# Altium footprint library Connectors.PcbLib: 69 footprints (part 1 of 5)
Each footprint in its own frame and in the unit in brackets; x right, y up, seen from the top. Pads: shape width x height; smd on the part's side, far side on the other; paste and mask are expansions set on the pad; w line width, h text height; cw(c..) or ccw(c..) is an arc to the next point about the centre after c.
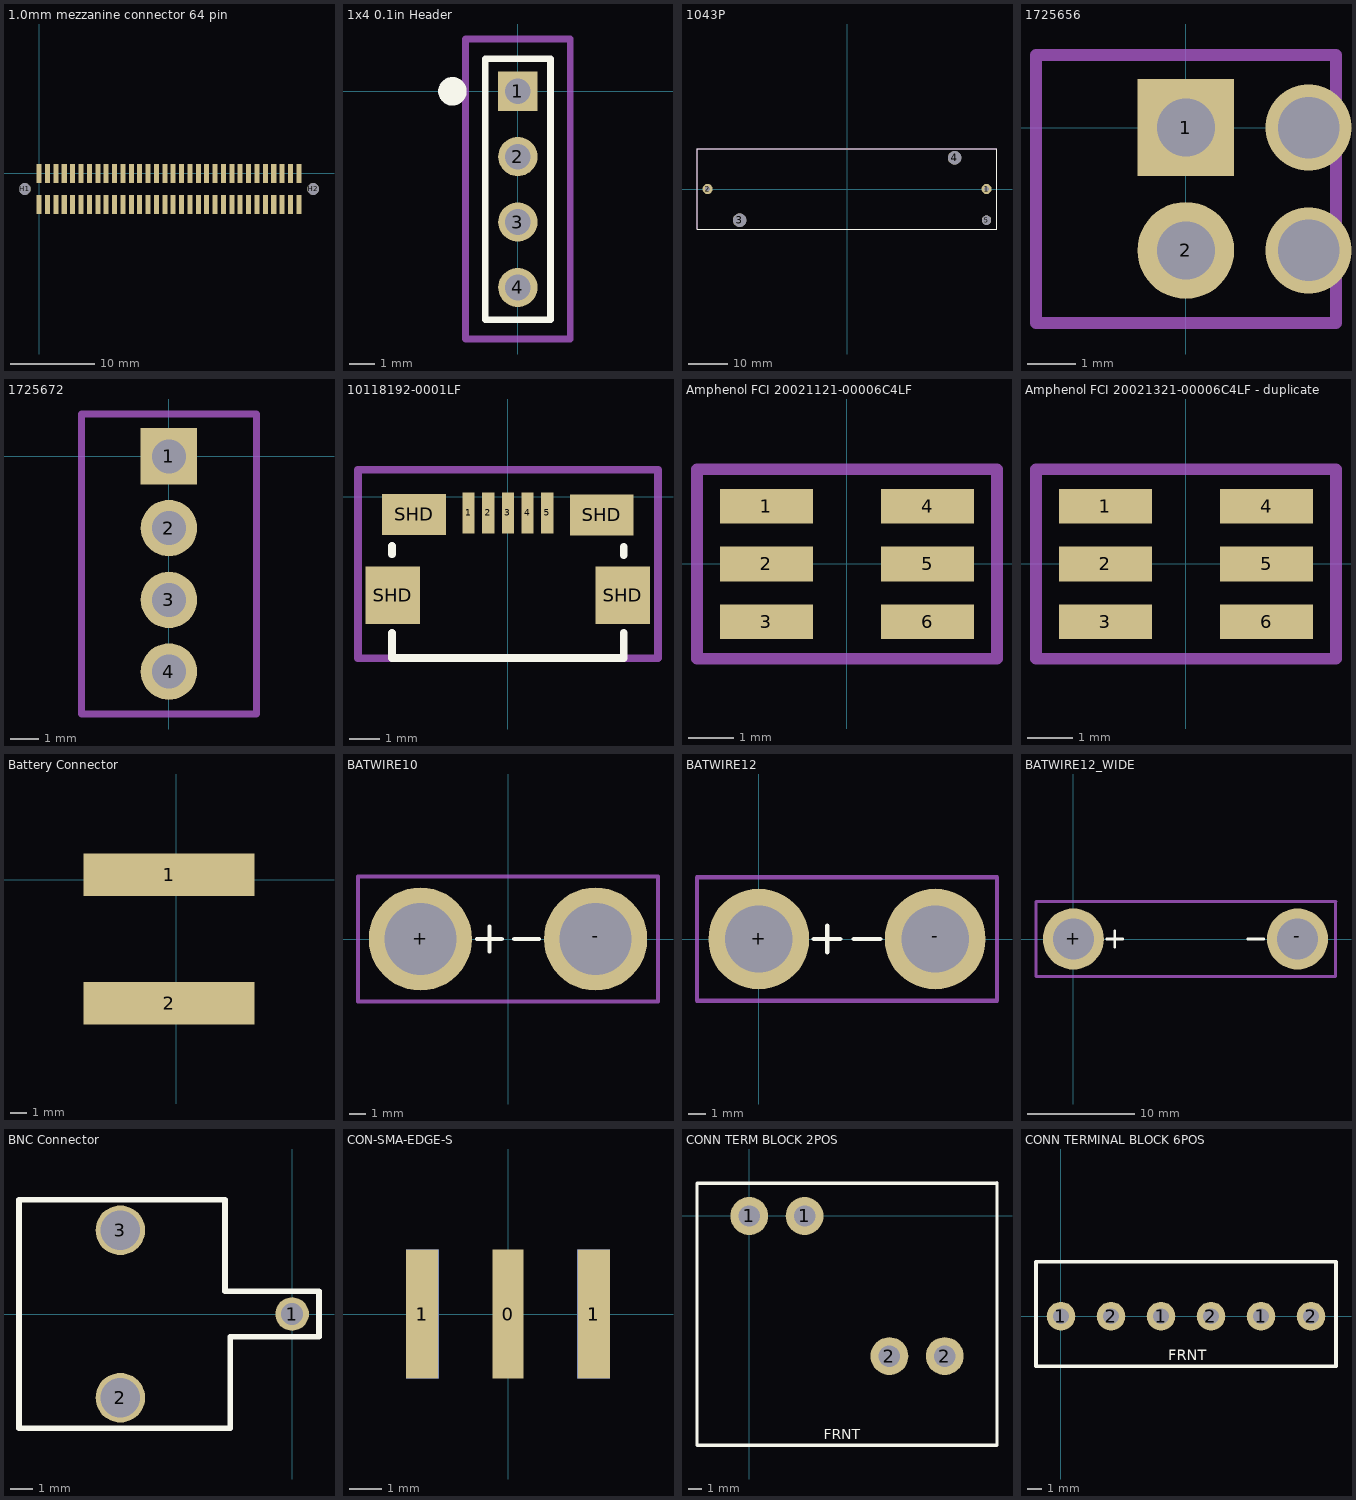
[diagram p0: the footprints below, top view; thin cyan lines are the x and y axes]

## 1.0mm mezzanine connector 64 pin [mm]
pads (66):
  rect 0.6x2.3 smd: 1(0,0) 2(1,0) 3(2,0) 4(3,0) 5(4,0) 6(5,0) 7(6,0) 8(7,0) 9(8,0) 10(9,0) 11(10,0) 12(11,0) 13(12,0) 14(13,0) 15(14,0) 16(15,0) 17(16,0) 18(17,0) 19(18,0) 20(19,0) 21(20,0) 22(21,0) 23(22,0) 24(23,0) 25(24,0) 26(25,0) 27(26,0) 28(27,0) 29(28,0) 30(29,0) 31(30,0) 32(31,0) 33(0,-3.7) 34(1,-3.7) 35(2,-3.7) 36(3,-3.7) 37(4,-3.7) 38(5,-3.7) 39(6,-3.7) 40(7,-3.7) 41(8,-3.7) 42(9,-3.7) 43(10,-3.7) 44(11,-3.7) 45(12,-3.7) 46(13,-3.7) 47(14,-3.7) 48(15,-3.7) 49(16,-3.7) 50(17,-3.7) 51(18,-3.7) 52(19,-3.7) 53(20,-3.7) 54(21,-3.7) 55(22,-3.7) 56(23,-3.7) 57(24,-3.7) 58(25,-3.7) 59(26,-3.7) 60(27,-3.7) 61(28,-3.7) 62(29,-3.7) 63(30,-3.7) 64(31,-3.7)
  round 1.4 hole 1.4 unplated: H1(-1.7,-1.85) H2(32.7,-1.85)

## 1x4 0.1in Header [mil]
pads (4):
  rect 60x60 hole 39.37: 1(0,0)
  round 60 hole 39.37: 2(0,-100) 3(0,-200) 4(0,-300)
Top Overlay:
  circle w23.62: c-100,0 r10
  lines w10: -50,-349.41 -50,50 50,50 50,-349.41 -50,-349.41
Mechanical 15:
  lines w10: -80,-378.94 -80,80 80,80 80,-378.94 -80,-378.94

## 1043P [mil] "HOLDER FOR 18650 BATTERY"
pads (5):
  round 104 hole 52: 1(1411,0) 2(-1411,0)
  round 136 hole 136 unplated: 3(-1087.5,-315) 4(1087.5,315)
  round 94 hole 94 unplated: 5(1411,-315)
Top Overlay:
  lines w10: -1518,-406.5 -1518,406.5 ; -1517,-406.5 1517,-406.5 1517,406.5 -1517,406.5
Mechanical 13:
  lines w10: -1518,-406.5 -1518,406.5 ; -1517,-406.5 1517,-406.5 1517,406.5 -1517,406.5
3D body "keystone-PN1043P.STEP": height 585, standoff -140, extent -1518.81,-408 1514.81,405

## 1725656 [mm] "CONN TERM BLOCK 2.54MM 2POS"
height 8.5
pads (2):
  rect 2x2 hole 1.2: 1(0,0)
  round 2 hole 1.2: 2(0,-2.54)
via 2.54,0 diameter 1.778 hole 1.27
via 2.54,-2.54 diameter 1.778 hole 1.27
Mechanical 15:
  lines w0.254: -3.096,-4.04 -3.096,1.5 3.104,1.5 3.104,-4.04 -3.048,-4.04

## 1725672 [mm] "CONN TERM BLOCK 2.54MM 2POS"
height 8.5
pads (4):
  rect 2x2 hole 1.2: 1(0,0)
  round 2 hole 1.2: 2(0,-2.54) 3(0,-5.08) 4(0,-7.62)
Mechanical 15:
  lines w0.254: -3.096,-9.12 3.104,-9.12 3.104,1.5 -3.096,1.5 -3.096,-9.12

## 10118192-0001LF [mm] "USB Micro-B Recepticle"
height 2.8
pads (9):
  rect 0.4x1.35 smd: 1(-1.3,-0.533) 2(-0.65,-0.533) 3(0,-0.533) 4(0.65,-0.533) 5(1.3,-0.533)
  rect 1.8x1.9 smd: SHD(-3.8,-3.248) SHD(3.8,-3.248)
  rect 2.1x1.35 smd: SHD(-3.1,-0.584) SHD(3.1,-0.598)
Top Overlay:
  lines w0.254: -3.825,-4.5 -3.825,-5.325 3.825,-5.325 3.825,-4.5 ; -3.825,-1.9 -3.825,-1.625 ; 3.825,-1.925 3.825,-1.65
Mechanical 1:
  lines w0.254: -2,-5.315 2,-5.315
Mechanical 15:
  lines w0.254: 4.95,-5.332 -4.95,-5.332 -4.95,0.889 4.95,0.889 ; 4.957,-5.325 4.957,0.889
3D body "UsbMicro.STEP": height 3.09, standoff 0.08, extent -3.956,-5.984 3.956,-0.324

## Amphenol FCI 20021121-00006C4LF [mm] "6 Positions Header Connector"
pads (6):
  rect 2.05x0.76 smd: 1(-1.775,1.27) 2(-1.775,0) 3(-1.775,-1.27) 4(1.775,1.27) 5(1.775,0) 6(1.775,-1.27)
Mechanical 15:
  lines w0.254: -3.302,-2.083 -3.302,2.083 3.302,2.083 3.302,-2.083 -3.302,-2.083
3D body: height 0.25, standoff 0, extent -2.286,1.346 -2.286,1.346
3D body "20021121-00006XXLFc.STEP": height 4.51, standoff 0.01, extent -2.75,-1.905 2.75,1.905

## Amphenol FCI 20021321-00006C4LF - duplicate [mm] "6 Position Receptacle Connector"
pads (6):
  rect 2.05x0.76 smd: 1(-1.775,1.27) 2(-1.775,0) 3(-1.775,-1.27) 4(1.775,1.27) 5(1.775,0) 6(1.775,-1.27)
Mechanical 15:
  lines w0.254: -3.302,-2.083 -3.302,2.083 3.302,2.083 3.302,-2.083 -3.302,-2.083
3D body "20021321-1006XXLFc.STEP": height 4.51, standoff 0.01, extent -2.301,-2.109 2.199,2.161

## Battery Connector [mil]
pads (2):
  rect 400x100 smd: 1(-17,12) 2(-17,-288)

## BATWIRE10 [mil] "Two 10AWG wires soldered directly to the board"
pads (2):
  round 246 hole 171: +(-209.65,0.98) -(207.68,0.98)
Top Overlay:
  lines w10: -74.72,0.98 -15.67,0.98 ; -45.2,-28.54 -45.2,30.51 ; 13.7,0.98 72.76,0.98
Mechanical 15:
  lines w10: 356.3,148.62 356.3,-147.64 -358.27,-147.64 -358.27,149.61 356.3,149.61

## BATWIRE12 [mm] "Two 12AWG wires soldered directly to the board"
pads (2):
  round 5.715 hole 3.81: +(0,0) -(10,0)
Top Overlay:
  lines w0.254: 3.127,0 4.627,0 ; 3.877,-0.75 3.877,0.75 ; 5.373,0 6.873,0
Mechanical 15:
  lines w0.254: -3.5,-3.5 -3.5,3.5 13.5,3.5 13.5,-3.5 -3.5,-3.5

## BATWIRE12_WIDE [mil] "Two 12AWG wires soldered directly to the board"
pads (2):
  round 225 hole 150: +(0,0) -(825.61,0)
Top Overlay:
  lines w10: 123.11,0 182.17,0 ; 152.64,-29.53 152.64,29.53 ; 642.72,0 701.77,0
Mechanical 15:
  lines w10: 965.55,137.8 965.55,-137.8 -137.8,-137.8 -137.8,137.8 967.52,137.8

## BNC Connector [mm] "For WM5524-ND"
height 14
pads (3):
  round 1.524 hole 1: 1(0,0)
  round 2.25 hole 1.8: 2(-7.8,-3.8) 3(-7.8,3.8)
Top Overlay:
  lines w0.25: -12.4,-5.182 -12.4,5.182 -3.048,5.182 -3.048,1.041 1.219,1.041 1.219,-1.041 -2.819,-1.041 -2.819,-5.182 -12.4,-5.182

## CON-SMA-EDGE-S [mm] "CONN SMA JACK STR EDGE MNT"
pads (5):
  rect 0.96x4 smd: 0(0,0)
  rect 1.01x4 smd: 1(-2.667,0) 1(2.667,0)
  rect 1.01x4 smd far side: 1(-2.667,0) 1(2.667,0)
3D body: height 0.25, standoff 0, extent 3.277,-2.083 3.277,-2.083
3D body: height 6.35, standoff 0, extent -3.175,-2.261 3.2,5.131

## CONN TERM BLOCK 2POS [mm] "CONN TERM BLOCK 2POS 10.16MM 60A"
height 29.7
pads (4):
  round 2.75 hole 1.55: 1(0,0) 1(4.01,0) 2(10.16,-10.16) 2(14.17,-10.16)
Top Overlay:
  lines w0.25: 17.96,-16.61 -3.79,-16.61 -3.79,2.39 17.96,2.39 ; 17.96,-16.6 17.96,2.4
  text "FRNT" at 5.4,-16.2 h0.75
3D body "CONN TERM BLOCK 2POS 1016MM 60A.stp": height 31.1, standoff -4.1, extent -3.822,-16.6 18.022,2.2

## CONN TERMINAL BLOCK 6POS [mm] "CONN TERMINAL BLOCK 6POS 3.5MM"
height 8.51
pads (6):
  round 2 hole 1.1: 1(0,0) 1(7,0) 1(14,0) 2(3.5,0) 2(10.5,0) 2(17.5,0)
Top Overlay:
  lines w0.25: -1.75,-3.5 19.25,-3.5 19.25,3.8 -1.75,3.8 -1.75,-3.5
  text "FRNT" at 7.5,-3.1 h0.75
3D body "CONN TERMINAL BLOCK 6POS 35MM.stp": height 8.51, standoff -3.5, extent -1.741,-3.445 19.341,3.845